# Altium footprint library Chestin_PcbLib.PcbLib: 203 footprints (part 3 of 13)
Each footprint in its own frame and in the unit in brackets; x right, y up, seen from the top. Pads: shape width x height; smd on the part's side, far side on the other; paste and mask are expansions set on the pad; w line width, h text height; cw(c..) or ccw(c..) is an arc to the next point about the centre after c.
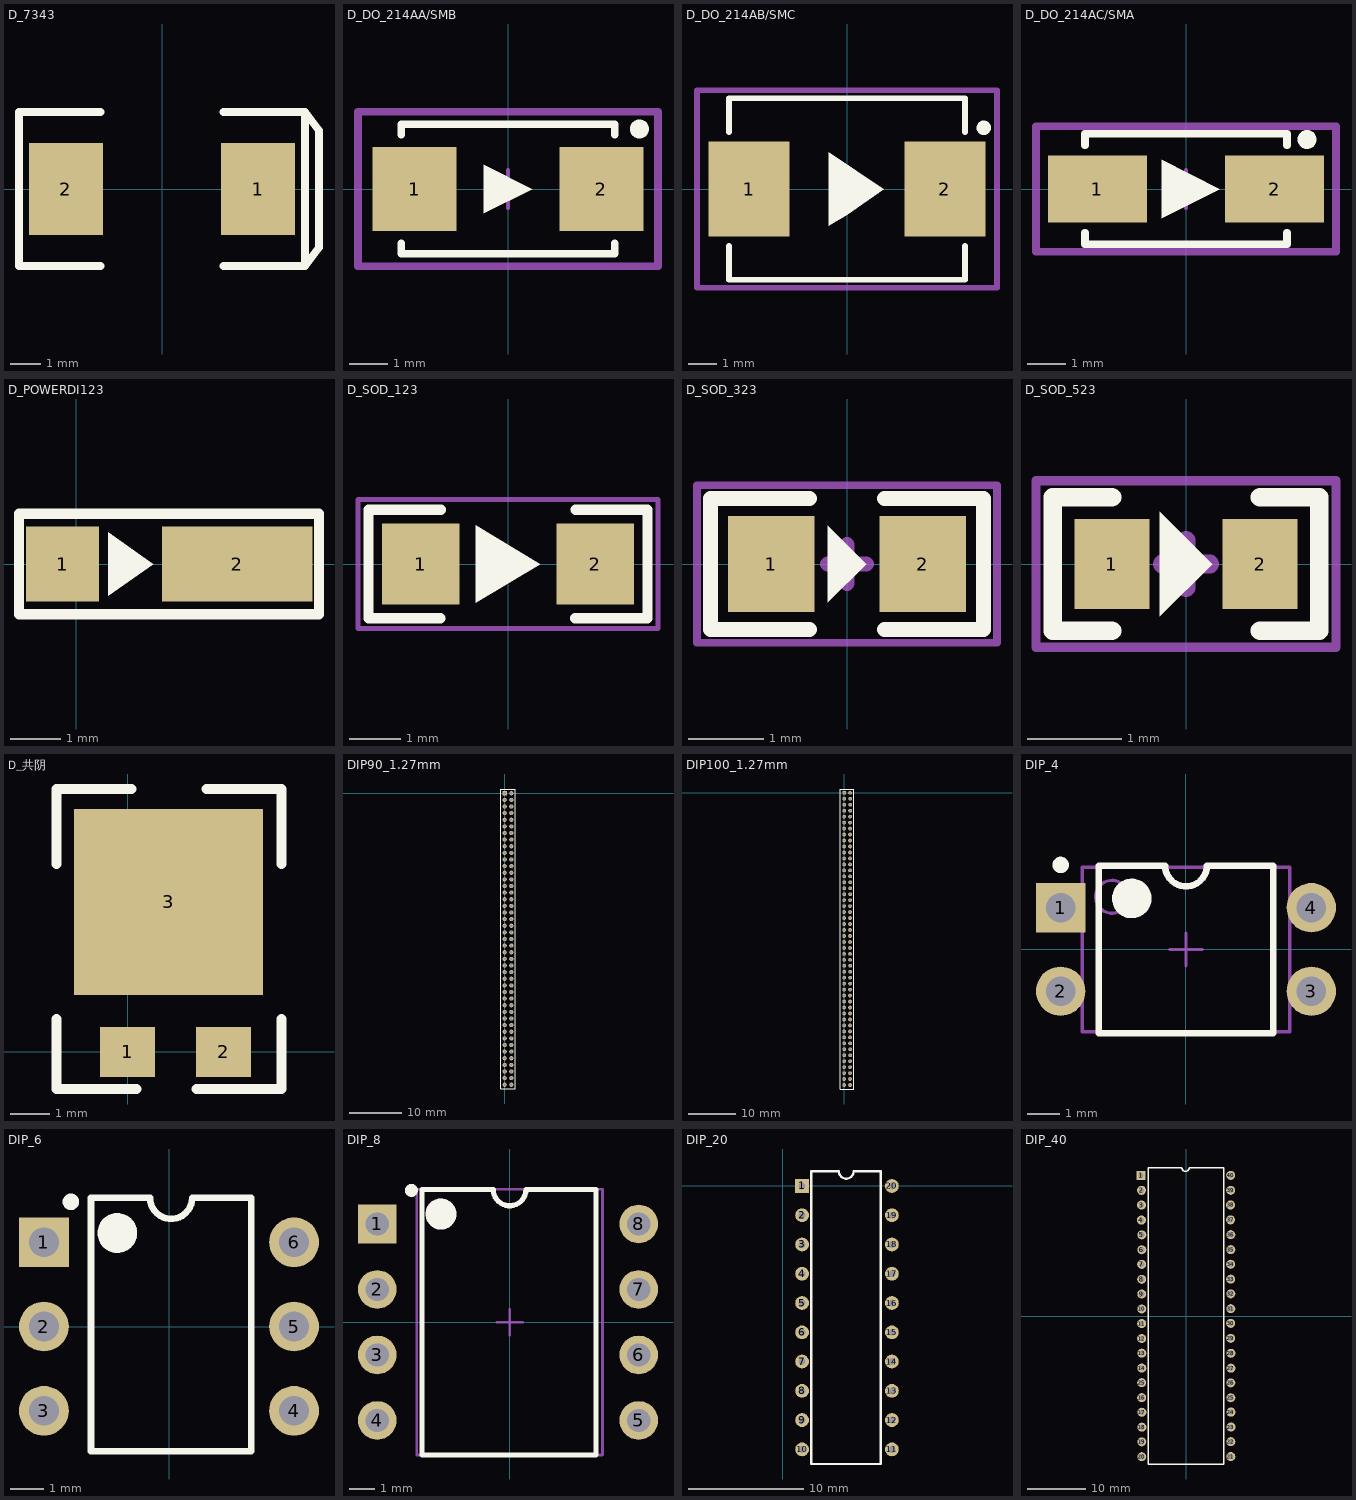
[diagram p2: the footprints below, top view; thin cyan lines are the x and y axes]

## D_7343 [mm]
pads (2):
  rect 2.4x3 smd: 1(3.12,0) 2(-3.12,0)
Top Overlay:
  lines w0.254: -2,-2.5 -4.647,-2.5 -4.647,2.5 -2,2.5 ; 2,-2.5 4.647,-2.5 ; 2,2.5 4.647,2.5 ; 4.647,-2.5 4.647,2.5 ; 4.647,-2.5 5.1,-1.9 5.1,1.9 4.647,2.5
3D body "User Library-AVX_D_CASE.STEP": height 3.01, standoff 0, extent -3.701,-2.225 3.7,2.225

## D_DO_214AA/SMB [mm] "2816   7mmX4mm二极管"
height 2.438
pads (2):
  rect 2.2x2.2 smd: 1(-2.45,0) 2(2.45,0)
Top Overlay:
  circle w0.25: c3.45,1.575 r0.125
  region: 0.635,0 -0.635,0.635 -0.635,-0.635
  lines w0.2: -2.8,-1.425 -2.8,-1.7 2.8,-1.7 2.8,-1.425 ; -2.8,1.425 -2.8,1.7 2.8,1.7 2.8,1.425
Mechanical 15:
  lines w0.1: -0.5,0 0.5,0 ; 0,-0.5 0,0.5
  lines w0.2: -3.937,-2.032 -3.937,2.032 3.937,2.032 3.937,-2.032 -3.937,-2.032
3D body "DO_214AA.STEP": height 2.12, standoff 0, extent -2.832,-1.778 2.832,1.778

## D_DO_214AB/SMC [mm] "3826   9.5mmX6.5mm二极管"
height 2.616
pads (2):
  rect 2.8x3.3 smd: 1(-3.4,0) 2(3.4,0)
Top Overlay:
  circle w0.25: c4.75,2.125 r0.125
  region: 1.27,0 0,-0.889 -0.635,-1.27 -0.635,1.27
  lines w0.2: -4.1,-1.975 -4.1,-3.15 4.1,-3.15 4.1,-1.975 ; -4.1,1.975 -4.1,3.15 4.1,3.15 4.1,1.975
Mechanical 15:
  lines w0.1: -0.5,0 0.5,0 ; 0,-0.5 0,0.5
  lines w0.2: -5.207,-3.429 -5.207,3.429 5.207,3.429 5.207,-3.429 -5.207,-3.429
3D body "DO_214AB.STEP": height 2.87, standoff -0.01, extent -3.975,-2.95 3.975,2.95

## D_DO_214AC/SMA [mm] "2812   7mmX3mm二极管"
height 2.438
pads (2):
  rect 2.6x1.75 smd: 1(-2.328,0) 2(2.328,0)
Top Overlay:
  circle w0.25: c3.175,1.3 r0.125
  region: -0.635,-0.762 -0.635,0 0.889,0
  region: 0.889,0 -0.635,0 -0.635,0.762
  lines w0.2: -2.65,-1.15 -2.65,-1.45 2.65,-1.45 2.65,-1.15 ; -2.65,1.15 -2.65,1.45 2.65,1.45 2.65,1.15
Mechanical 15:
  lines w0.1: -0.5,0 0.5,0 ; 0,-0.5 0,0.5
  lines w0.2: -3.937,-1.651 3.937,-1.651 3.937,1.651 -3.937,1.651 -3.937,-1.651
3D body "DO_214AC.STEP": height 2.41, standoff 0, extent -2.642,-1.448 2.641,1.448

## D_POWERDI123 [mm]
pads (2):
  rect 1.45x1.5 smd: 1(-0.275,0)
  rect 3x1.5 smd: 2(3.2,0)
Top Overlay:
  region: 1.524,0 1.27,0 0.635,0.635 0.635,-0.635
  region: 0.635,0.635 1.27,0 1.524,0
  lines w0.203: -1.143,-1 -1.143,1 4.826,1 4.826,-1 -1.143,-1
3D body "TVS.STEP": height 1.4, standoff 0.15, extent -0.131,-0.965 3.769,0.965

## D_SOD_123 [mm] "1206大小，二极管"
pads (2):
  rect 1.52x1.6 smd: 1(-1.713,0) 2(1.712,0)
Top Overlay:
  region: -0.635,0.762 -0.635,-0.762 0.635,0
  lines w0.2: -1.331,-1.067 -2.743,-1.067 -2.743,1.067 -1.323,1.067 ; 1.322,-1.067 2.743,-1.067 2.743,1.067 1.331,1.067
Mechanical 15:
  lines w0.1: -2.946,-1.27 -2.946,1.27 2.946,1.27 2.946,-1.27 -2.946,-1.27
  lines w0.2: -0.254,0 0.254,0 ; 0,-0.254 0,0.254
3D body "零件2.STEP": height 1.5, standoff 0, extent -1.873,-0.75 2.127,0.75

## D_SOD_323 [mil] "0805[2012]大小，二极管"
pads (2):
  rect 45x50 smd: 1(-39.5,0) 2(39.5,0)
Top Overlay:
  region: -10,20 -10,-20 10,0
  lines w7.87: -19.5,-34 -71,-34 -71,34 -19.5,34 ; 19.5,-34 71,-34 71,34 19.5,34
Mechanical 15:
  lines w3.94: -78,-41 78,-41 78,41 -78,41 -78,-41
  lines w7.87: -10,0 10,0 ; 0,-10 0,10
3D body "LED_0805(B).STEP": height 39.37, standoff -0.39, extent -39.99,-24.99 40.01,25

## D_SOD_523 [mm] "0603大小，二极管"
pads (2):
  rect 0.8x0.96 smd: 1(-0.79,0) 2(0.79,0)
Top Overlay:
  region: -0.279,0.559 -0.279,-0.559 0.279,0
  lines w0.2: -0.79,-0.711 -1.422,-0.711 -1.422,0.711 -0.79,0.711 ; 0.79,-0.711 1.422,-0.711 1.422,0.711 0.79,0.711
Mechanical 15:
  lines w0.1: -1.6,-0.889 1.6,-0.889 1.6,0.889 -1.6,0.889 -1.6,-0.889
  lines w0.2: -0.254,0 0.254,0 ; 0,-0.254 0,0.254

## D_共阴 [mm]
pads (3):
  rect 1.4x1.27 smd: 1(0,0) 2(2.44,0)
  rect 4.8x4.72 smd: 3(1.04,3.805)
Top Overlay:
  lines w0.254: -1.805,0.833 -1.805,-0.945 0.227,-0.945 ; -1.805,4.77 -1.805,6.675 0.1,6.675 ; 1.751,-0.945 3.91,-0.945 3.91,0.833 ; 2.005,6.675 3.91,6.675 3.91,4.77

## DIP90_1.27mm [mm]
pads (90):
  rect 0.8x0.8 hole 0.5: 1(0,0)
  round 0.8 hole 0.5: 2(0,-1.27) 3(0,-2.54) 4(0,-3.81) 5(0,-5.08) 6(0,-6.35) 7(0,-7.62) 8(0,-8.89) 9(0,-10.16) 10(0,-11.43) 11(0,-12.7) 12(0,-13.97) 13(0,-15.24) 14(0,-16.51) 15(0,-17.78) 16(0,-19.05) 17(0,-20.32) 18(0,-21.59) 19(0,-22.86) 20(0,-24.13) 21(0,-25.4) 22(0,-26.67) 23(0,-27.94) 24(0,-29.21) 25(0,-30.48) 26(0,-31.75) 27(0,-33.02) 28(0,-34.29) 29(0,-35.56) 30(0,-36.83) 31(0,-38.1) 32(0,-39.37) 33(0,-40.64) 34(0,-41.91) 35(0,-43.18) 36(0,-44.45) 37(0,-45.72) 38(0,-46.99) 39(0,-48.26) 40(0,-49.53) 41(0,-50.8) 42(0,-52.07) 43(0,-53.34) 44(0,-54.61) 45(0,-55.88) 46(1.27,-55.88) 47(1.27,-54.61) 48(1.27,-53.34) 49(1.27,-52.07) 50(1.27,-50.8) 51(1.27,-49.53) 52(1.27,-48.26) 53(1.27,-46.99) 54(1.27,-45.72) 55(1.27,-44.45) 56(1.27,-43.18) 57(1.27,-41.91) 58(1.27,-40.64) 59(1.27,-39.37) 60(1.27,-38.1) 61(1.27,-36.83) 62(1.27,-35.56) 63(1.27,-34.29) 64(1.27,-33.02) 65(1.27,-31.75) 66(1.27,-30.48) 67(1.27,-29.21) 68(1.27,-27.94) 69(1.27,-26.67) 70(1.27,-25.4) 71(1.27,-24.13) 72(1.27,-22.86) 73(1.27,-21.59) 74(1.27,-20.32) 75(1.27,-19.05) 76(1.27,-17.78) 77(1.27,-16.51) 78(1.27,-15.24) 79(1.27,-13.97) 80(1.27,-12.7) 81(1.27,-11.43) 82(1.27,-10.16) 83(1.27,-8.89) 84(1.27,-7.62) 85(1.27,-6.35) 86(1.27,-5.08) 87(1.27,-3.81) 88(1.27,-2.54) 89(1.27,-1.27) 90(1.27,0)
Top Overlay:
  lines w0.102: -0.787,-56.693 2.057,-56.693 2.057,0.813 -0.787,0.813 -0.787,-56.693

## DIP100_1.27mm [mm]
pads (100):
  rect 0.8x0.8 hole 0.5: 1(0,0)
  round 0.8 hole 0.5: 2(0,-1.27) 3(0,-2.54) 4(0,-3.81) 5(0,-5.08) 6(0,-6.35) 7(0,-7.62) 8(0,-8.89) 9(0,-10.16) 10(0,-11.43) 11(0,-12.7) 12(0,-13.97) 13(0,-15.24) 14(0,-16.51) 15(0,-17.78) 16(0,-19.05) 17(0,-20.32) 18(0,-21.59) 19(0,-22.86) 20(0,-24.13) 21(0,-25.4) 22(0,-26.67) 23(0,-27.94) 24(0,-29.21) 25(0,-30.48) 26(0,-31.75) 27(0,-33.02) 28(0,-34.29) 29(0,-35.56) 30(0,-36.83) 31(0,-38.1) 32(0,-39.37) 33(0,-40.64) 34(0,-41.91) 35(0,-43.18) 36(0,-44.45) 37(0,-45.72) 38(0,-46.99) 39(0,-48.26) 40(0,-49.53) 41(0,-50.8) 42(0,-52.07) 43(0,-53.34) 44(0,-54.61) 45(0,-55.88) 46(0,-57.15) 47(0,-58.42) 48(0,-59.69) 49(0,-60.96) 50(0,-62.23) 51(1.27,-62.23) 52(1.27,-60.96) 53(1.27,-59.69) 54(1.27,-58.42) 55(1.27,-57.15) 56(1.27,-55.88) 57(1.27,-54.61) 58(1.27,-53.34) 59(1.27,-52.07) 60(1.27,-50.8) 61(1.27,-49.53) 62(1.27,-48.26) 63(1.27,-46.99) 64(1.27,-45.72) 65(1.27,-44.45) 66(1.27,-43.18) 67(1.27,-41.91) 68(1.27,-40.64) 69(1.27,-39.37) 70(1.27,-38.1) 71(1.27,-36.83) 72(1.27,-35.56) 73(1.27,-34.29) 74(1.27,-33.02) 75(1.27,-31.75) 76(1.27,-30.48) 77(1.27,-29.21) 78(1.27,-27.94) 79(1.27,-26.67) 80(1.27,-25.4) 81(1.27,-24.13) 82(1.27,-22.86) 83(1.27,-21.59) 84(1.27,-20.32) 85(1.27,-19.05) 86(1.27,-17.78) 87(1.27,-16.51) 88(1.27,-15.24) 89(1.27,-13.97) 90(1.27,-12.7) 91(1.27,-11.43) 92(1.27,-10.16) 93(1.27,-8.89) 94(1.27,-7.62) 95(1.27,-6.35) 96(1.27,-5.08) 97(1.27,-3.81) 98(1.27,-2.54) 99(1.27,-1.27) 100(1.27,0)
Top Overlay:
  lines w0.2: -0.813,-63.068 2.032,-63.068 2.032,0.813 -0.813,0.813 -0.813,-63.068

## DIP_4 [mm]
pads (4):
  rect 1.5x1.5 hole 0.9: 1(-3.81,1.27)
  round 1.5 hole 0.9: 2(-3.81,-1.27) 3(3.81,-1.27) 4(3.81,1.27)
Top Overlay:
  circle w0.6: c-1.65,1.55 r0.3
  circle w0.25: c-3.81,2.57 r0.125
  lines w0.2: -2.65,-2.55 2.65,-2.55 2.65,2.55 0.635,2.55 cw(c0,2.55) -0.635,2.55 -2.65,2.55 -2.65,-2.55
Mechanical 13:
  circle w0.1: c-2.25,1.6 r0.5
  lines w0.1: -3.15,-2.5 3.15,-2.5 3.15,2.5 -3.15,2.5 -3.15,-2.5
Mechanical 15:
  lines w0.1: -0.5,0 0.5,0 ; 0,-0.5 0,0.5
3D body: height 5.6, standoff 0, extent -3.15,-2.5 3.15,2.5

## DIP_6 [mm]
pads (6):
  rect 1.5x1.5 hole 0.9: 1(-3.772,2.54)
  round 1.5 hole 0.9: 2(-3.772,0) 3(-3.772,-2.54) 4(3.772,-2.54) 5(3.772,0) 6(3.772,2.54)
Top Overlay:
  circle w0.25: c-2.957,3.759 r0.125
  circle w0.6: c-1.557,2.819 r0.3
  lines w0.2: -2.349,-3.759 -2.349,3.88 -0.572,3.88 ccw(c0.064,3.88) 0.699,3.88 2.476,3.88 2.476,-3.759 -2.349,-3.759
3D body "DIP-6.STEP": height 4.31, standoff -3.28, extent -4.038,-3.991 3.962,4.089

## DIP_8 [mm]
pads (8):
  rect 1.5x1.5 hole 0.9: 1(-5.131,3.81)
  round 1.5 hole 0.9: 2(-5.131,1.27) 3(-5.131,-1.27) 4(-5.131,-3.81) 5(5.004,-3.81) 6(5.004,-1.27) 7(5.004,1.27) 8(5.004,3.81)
Top Overlay:
  circle w0.6: c-2.662,4.191 r0.3
  circle w0.25: c-3.81,5.11 r0.125
  lines w0.2: -3.404,-5.15 3.353,-5.15 3.353,5.15 0.635,5.15 cw(c0,5.15) -0.635,5.15 -3.404,5.15 -3.404,-5.15
Mechanical 13:
  circle w0.1: c-2.7,4.25 r0.5
  lines w0.1: -3.6,-5.15 3.6,-5.15 3.6,5.15 -3.6,5.15 -3.6,-5.15
Mechanical 15:
  lines w0.1: -0.5,0 0.5,0 ; 0,-0.5 0,0.5
3D body: height 5.08, standoff 0, extent -3.6,-5.15 3.6,5.15

## DIP_20 [mm]
pads (20):
  rect 1.2x1.2 hole 0.6: 1(1.668,0)
  round 1.2 hole 0.6: 2(1.668,-2.54) 3(1.668,-5.08) 4(1.668,-7.62) 5(1.668,-10.16) 6(1.668,-12.7) 7(1.668,-15.24) 8(1.668,-17.78) 9(1.668,-20.32) 10(1.668,-22.86) 11(9.459,-22.86) 12(9.459,-20.32) 13(9.459,-17.78) 14(9.459,-15.24) 15(9.459,-12.7) 16(9.459,-10.16) 17(9.459,-7.62) 18(9.459,-5.08) 19(9.459,-2.54) 20(9.459,0)
Top Overlay:
  lines w0.2: 2.464,-24.13 8.484,-24.13 8.484,1.27 6.135,1.27 cw(c5.5,1.27) 4.865,1.27 2.464,1.27 2.464,-24.13
3D body "DIP-20-300.STEP": height 4.5, standoff -3.5, extent 1.657,-24.052 9.418,1.548

## DIP_40 [mil]
pads (40):
  rect 61x61 hole 35: 1(-303.75,949.38)
  round 61 hole 35: 2(-300.42,848.96) 3(-300.42,749.79) 4(-301.25,648.13) 5(-298.33,548.54) 6(-298.33,447.71) 7(-299.17,348.96) 8(-299.17,248.13) 9(-298.75,148.54) 10(-298.75,47.71) 11(-299.58,-51.04) 12(-299.58,-151.87) 13(-298.33,-250.62) 14(-298.33,-351.46) 16(-299.17,-551.04) 17(-297.92,-649.79) 18(-297.92,-750.62) 19(-298.75,-849.37) 20(-298.75,-950.21) 21(302.92,-949.37) 22(302.92,-848.54) 23(303.75,-749.79) 24(303.75,-648.96) 25(-299.17,-450.21) 25(302.5,-551.87) 26(302.5,-451.04) 27(303.33,-352.29) 28(303.33,-251.46) 29(301.67,-150.21) 30(301.67,-49.37) 31(302.5,49.38) 32(302.5,150.21) 33(301.67,248.96) 34(301.67,349.79) 35(302.5,448.54) 36(302.5,549.38) 37(300.83,649.79) 38(300.83,750.63) 39(301.67,849.38) 40(301.67,950.21)
Top Overlay:
  lines w10: -254.17,-999.37 253.75,-999.37 253.75,1001.88 21.67,1001.88 cw(c-3.33,1001.88) -28.33,1001.88 -254.17,1001.88 -254.17,-999.37
3D body "DIP40.step": height 224.41, standoff -101.57, extent -303.84,-1025.48 306,1039.48